# Altium footprint library ZabugorLib.PcbLib: 89 footprints (part 2 of 6)
Each footprint in its own frame and in the unit in brackets; x right, y up, seen from the top. Pads: shape width x height; smd on the part's side, far side on the other; paste and mask are expansions set on the pad; w line width, h text height; cw(c..) or ccw(c..) is an arc to the next point about the centre after c.
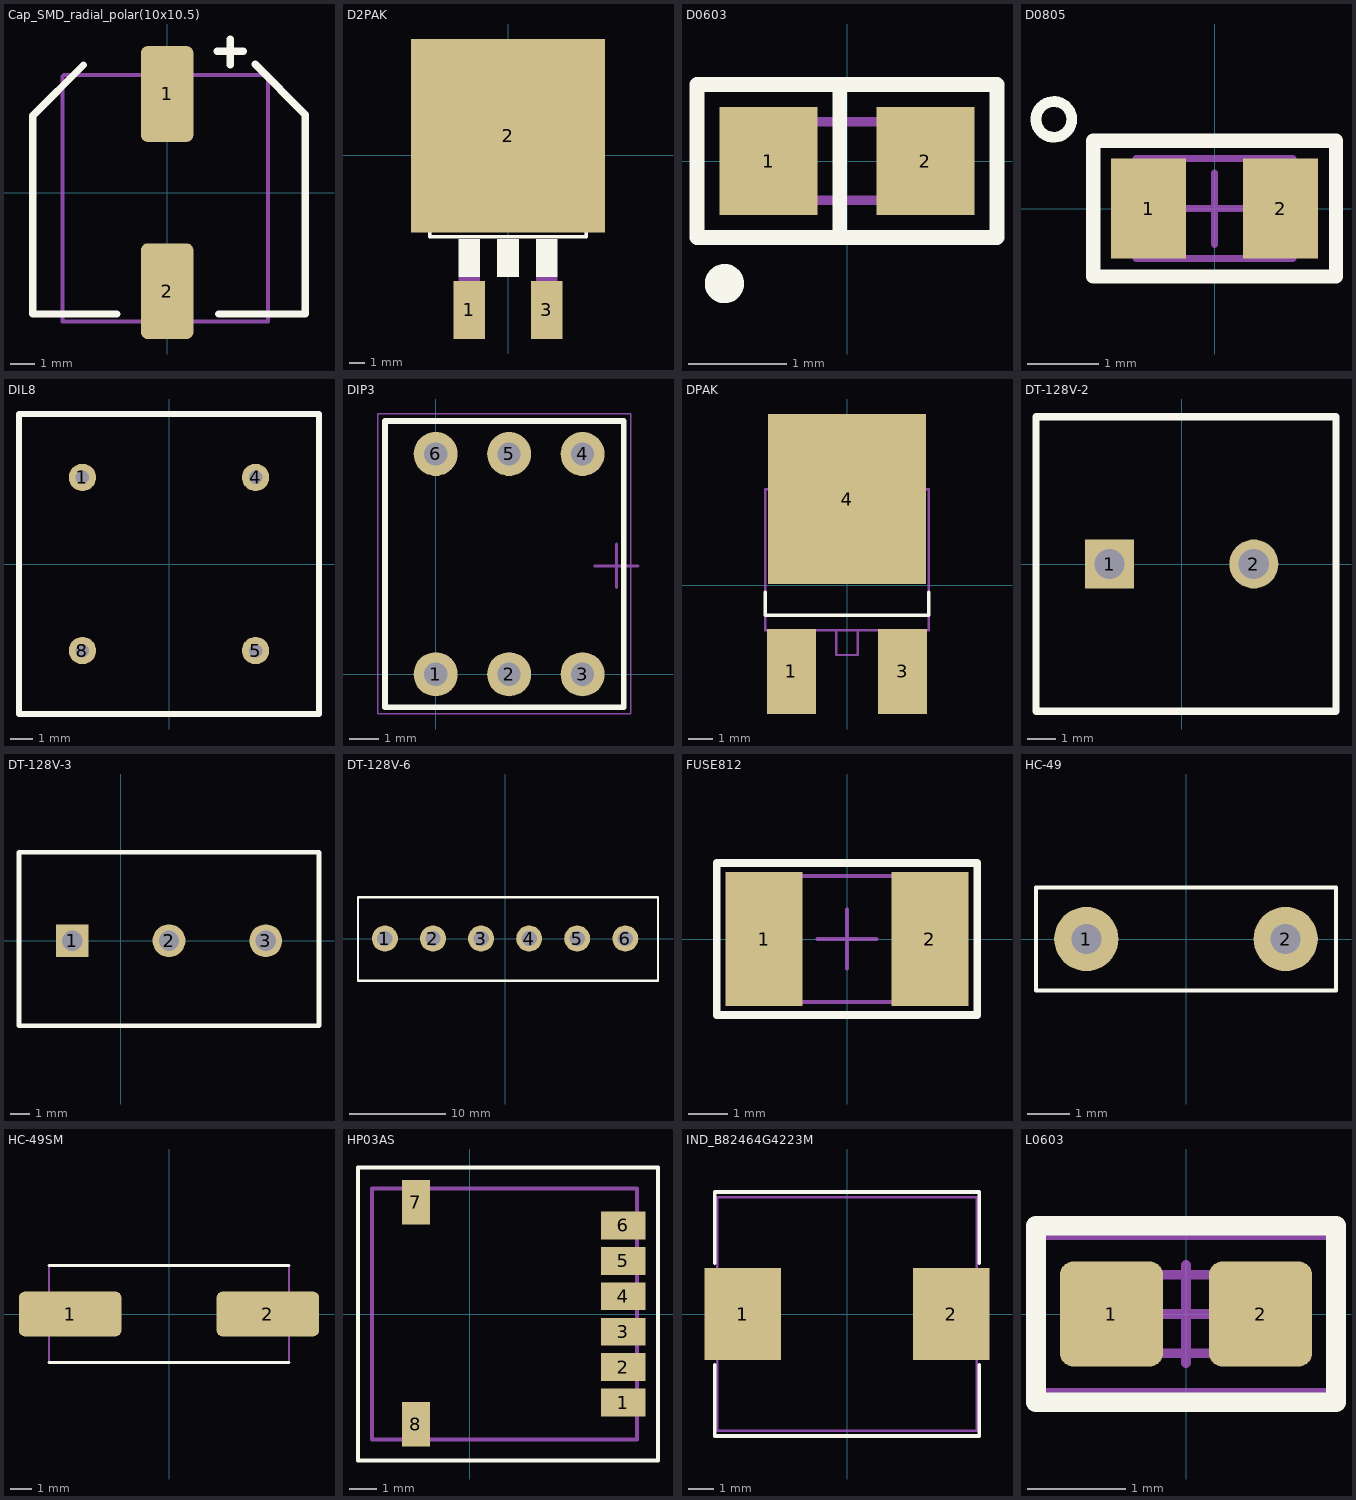
[diagram p1: the footprints below, top view; thin cyan lines are the x and y axes]

## Cap_SMD_radial_polar(10x10.5) [mm] "ECAP SMD, 220 мкФ, 35В"
height 10
pads (2):
  rrect25% 2.12x3.86 smd: 1(0,3.98) 2(0,-3.98)
Top Overlay:
  lines w0.3: -3.375,5.15 -5.425,3.1 -5.425,-4.9 -2.025,-4.9 ; 2.025,5.7 3.075,5.7 ; 2.075,-4.9 5.575,-4.9 5.575,3.1 ; 2.55,5.15 2.55,6.2 ; 3.55,5.175 5.575,3.15
Mechanical 7:
  lines w0.15: -4.225,-5.2 -4.225,4.7 -4.175,4.75 4.075,4.75 4.075,-5.2 -4.225,-5.2
3D body "User Library-ALU-F.STEP": height 10.2, standoff 0, extent -4.175,-5.15 4.125,4.75

## D2PAK [mil]
pads (3):
  rect 82x150 smd: 1(-100,-400) 3(100,-400)
  rect 500x500 smd: 2(0,50)
Top Overlay:
  rectangle: -128,-315 -72,-217
  rectangle: 72,-315 128,-217
  rectangle: -28,-315 28,-217
  lines w10: -202,-141 -202,-211 202,-211 202,-141
Mechanical 16:
  rectangle: -122,-425 -78,-369
  rectangle: -128,-371 -72,-315
  rectangle: 78,-425 122,-369
  rectangle: 72,-371 128,-315
  lines w10: -202,-211 -202,125 ; 202,-211 202,125 ; -202,125 -202,135 -133,179 123,179 202,125 ; -202,125 202,125
3D body "User Library-DPAK.step": height 198.23, standoff 0.67, extent -203.15,-442.91 196.85,158.02

## D0603 [mm]
height 1.1
pads (2):
  rect 1x1.1 smd: 1(-0.8,0) 2(0.8,0)
Top Overlay:
  circle w0.2: c-1.25,-1.25 r0.1
  lines w0.15: -0.075,-0.78 -0.075,0.78 ; -1.53,-0.78 1.53,-0.78 1.53,0.78 -1.53,0.78 -1.53,-0.78
Mechanical 9:
  text ".Comment" at -0.61,-1.33 h0.6
  text ".Designator" at -0.62,1 h0.8
Mechanical 11:
  lines w0.1: -0.7,-0.4 -0.7,0.4 ; -0.6,-0.4 -0.6,0.4 ; -0.5,-0.4 -0.5,0.4 ; -0.8,-0.4 -0.8,0.4 0.8,0.4 0.8,-0.4 -0.8,-0.4
3D body "User Library-LED_0603_R.STEP": height 0.6, standoff 0, extent -0.8,-0.4 0.8,0.4

## D0805 [mm] "Chip Resistor, 2-Leads, Body 2,10x1,30mm, IPC Medium Density"
height 0.55
pads (2):
  rect 1.05x1.4 smd: 1(-0.925,0) 2(0.925,0)
Top Overlay:
  circle w0.15: c-2.25,1.25 r0.25
  lines w0.2: -1.7,-0.95 -1.7,0.95 1.7,0.95 1.7,-0.95 -1.7,-0.95
Mechanical 9:
  text ".Comment" at -1,-0.5 h0.8
  text ".Designator" at -1,0.25 h1
Mechanical 11:
  lines w0.1: -1.1,-0.7 -1.1,0.7 1.1,0.7 1.1,-0.7 -1.1,-0.7
Mechanical 15:
  lines w0.05: -1.7,-0.95 1.7,-0.95 1.7,0.95 -1.7,0.95 -1.7,-0.95
  lines w0.1: -0.5,0 0.5,0 ; 0,-0.5 0,0.5
3D body "User Library-LED0805.step": height 0.8, standoff 0, extent -1.05,-0.675 1.05,0.675

## DIL8 [mm] "Кварцевый генератор 12.9х12.9"
pads (4):
  round 1.2 hole 0.6: 1(-3.81,3.81) 4(3.81,3.81) 5(3.81,-3.81) 8(-3.81,-3.81)
Top Overlay:
  lines w0.254: -6.6,-6.6 -6.6,6.6 6.6,6.6 6.6,-6.6 -6.6,-6.6
3D body "User Library-OSC_DIP-8.step": height 4.6, standoff -2, extent -6.35,-6.35 6.35,6.35

## DIP3 [mil]
pads (6):
  round 60 hole 31.5: 1(0,0) 2(100,0) 3(200,0) 4(200,300) 5(100,300) 6(0,300)
Top Overlay:
  lines w7.87: -68.9,-44.88 255.91,-44.88 255.91,344.88 -68.9,344.88 -68.9,-44.88
Mechanical 9:
  text ".Comment" at 49.21,118.11 h31.5
  text ".Designator" at 49.21,147.64 h39.37
Mechanical 11:
  lines w3.94: -68.9,-45.28 -68.9,344.49 255.91,344.49 255.91,-45.28 -68.9,-45.28
Mechanical 15:
  lines w1.97: -78.74,-54.13 265.75,-54.13 265.75,354.33 -78.74,354.33 -78.74,-54.13
  lines w3.94: 216.54,147.64 275.59,147.64 ; 246.06,118.11 246.06,177.17
3D body "User Library-switch 3.step": height 275.59, standoff -145.67, extent -68.9,-43.31 251.34,346.46

## DPAK [mm]
height 2.4
pads (3):
  rect 2x3.5 smd: 1(-2.285,-3.55) 3(2.285,-3.55)
  rect 6.5x7 smd: 4(0,3.55)
Top Overlay:
  lines w0.15: -3.36,-0.3 -3.36,-1.24 3.36,-1.24 3.36,-0.3
Mechanical 7:
  lines w0.1: -2.855,-1.85 -2.855,-4.44 -1.715,-4.44 -1.715,-1.85 ; -2.73,3.95 -2.73,5.98 2.73,5.98 2.73,3.95 ; -0.44,-1.85 -0.44,-2.87 0.44,-2.87 0.44,-1.85 ; 1.715,-1.85 1.715,-4.44 2.855,-4.44 2.855,-1.85 ; -3.36,-1.85 3.36,-1.85 3.36,3.95 -3.36,3.95 -3.36,-1.85
Mechanical 10:
  text ".Designator" at -0.85,8.28 h0.8
  text ".Comment" at -0.73,7.63 h0.6
3D body "User Library-D-PAK.step": height 2.3, standoff 0, extent -3.247,-3.625 3.247,5.875

## DT-128V-2 [mm]
pads (2):
  rect 1.7x1.7 hole 1.05: 1(-2.5,0)
  round 1.7 hole 1.05: 2(2.5,0)
Top Overlay:
  lines w0.254: -5.05,-5.1 -5.05,5.1 5.35,5.1 5.35,-5.1 -5.05,-5.1
3D body "User Library-DG128-5_0-02P-14.step": height 14.3, standoff -3.5, extent -5,-5.069 5.3,5.131

## DT-128V-3 [mm]
pads (3):
  rect 1.7x1.7 hole 1.05: 1(-2.5,0)
  round 1.7 hole 1.05: 2(2.5,0) 3(7.5,0)
Top Overlay:
  lines w0.254: -5.25,-4.394 10.25,-4.394 10.25,4.572 -5.25,4.572 -5.25,-4.394
3D body "DT128V_3.STEP": height 15.2, standoff -3.5, extent -5.25,-4.394 10.25,4.606

## DT-128V-6 [mm]
pads (6):
  round 2.7 hole 1.6: 1(-12.5,0) 2(-7.5,0) 3(-2.5,0) 4(2.5,0) 5(7.5,0) 6(12.5,0)
Top Overlay:
  lines w0.254: -15.3,-4.4 -4.35,-4.4 6.05,-4.4 15.9,-4.4 15.9,4.3 4.55,4.3 -5.85,4.3 -15.3,4.3 -15.3,-4.4
3D body "37822.stp": height 10, standoff -3.5, extent -14.985,-4.1 15.585,4.05

## FUSE812 [mm] "Самовосстанавливающийся предохранитель"
pads (2):
  rect 1.95x3.4 smd: 1(-2.1,0) 2(2.1,0)
Top Overlay:
  lines w0.2: -3.3,-1.925 -3.3,1.925 3.3,1.925 3.3,-1.925 -3.3,-1.925
Mechanical 9:
  text ".Designator" at -1.25,0.25 h1
  text ".Comment" at -1.25,-0.5 h0.8
Mechanical 11:
  lines w0.1: -2.325,-1.6 2.325,-1.6 2.325,1.6 -2.325,1.6 -2.325,-1.6
Mechanical 15:
  lines w0.05: -3.3,-1.925 3.3,-1.925 3.3,1.925 -3.3,1.925 -3.3,-1.925
  lines w0.1: -0.75,0 0.75,0 ; 0,-0.75 0,0.75
3D body "User Library-fuse1812.step": height 1.32, standoff 0, extent -2.41,-1.61 2.41,1.61

## HC-49 [mm] "Кварцевый резонатор"
pads (2):
  round 1.5 hole 0.7: 1(-2.325,0) 2(2.325,0)
Top Overlay:
  lines w0.1: -3.5,-1.2 -3.5,1.2 3.5,1.2 3.5,-1.2 -1.3,-1.2 -3.5,-1.2
3D body "User Library-HC49_Crystal.step": height 3.6, standoff -12.7, extent -5.675,-2.325 5.675,2.325

## HC-49SM [mm] "Кварцевый резонатор поверхностного монтажа"
pads (2):
  rrect25% 4.87x2.13 smd: 1(-4.7,0) 2(4.7,0)
Top Overlay:
  lines w0.15: -5.7,-2.3 5.7,-2.3 ; -5.7,2.3 5.7,2.3
Mechanical 7:
  lines w0.1: -5.7,-2.3 -5.7,2.3 5.7,2.3 5.7,-2.3 -5.7,-2.3
3D body "User Library-HC49_Crystal_SM.step": height 4.5, standoff -0.01, extent -6.95,-2.5 6.95,2.5

## HP03AS [mm] "Integrated pressure sensor"
pads (8):
  rect 1.6x1 smd: 1(5.5,-3.175) 2(5.5,-1.905) 3(5.5,-0.635) 4(5.5,0.635) 5(5.5,1.905) 6(5.5,3.175)
  rect 1x1.6 smd: 7(-1.925,4) 8(-1.925,-3.95)
Top Overlay:
  lines w0.15: -4,-5.25 -4,5.25 6.75,5.25 6.75,-5.25 -4,-5.25
Mechanical 7:
  lines w0.15: -3.5,-4.5 6,-4.5 6,4.5 -3.5,4.5 -3.5,-4.5
3D body "HP03SA.STEP": height 4.6, standoff -0.04, extent -3.525,-4.475 6.015,4.525

## IND_B82464G4223M [mm] "22 мкГн, 2.25 А, 10х10, Катушка индуктивности SMD"
pads (2):
  rect 3x3.6 smd: 1(-4.1,0) 2(4.1,0)
Top Overlay:
  lines w0.15: -5.2,-2 -5.2,-4.8 5.2,-4.8 5.2,-2 ; -5.2,2 -5.2,4.8 5.2,4.8 5.2,2
Mechanical 7:
  lines w0.1: -5.1,-4.6 -5.1,4.6 5.1,4.6 5.1,-4.6 -5.1,-4.6
Mechanical 10:
  text ".Comment" at -1.1,-6.1 h0.6
  text ".Designator" at -1.5,5.5 h0.8
3D body "User Library-10x10 SMT Power Inductor.step": height 4.8, standoff 0, extent -5.2,-5.2 5.2,5.2

## L0603 [mm]
height 0.8
pads (2):
  rrect25% 1.05x1.07 smd paste-5: 1(-0.76,0) 2(0.76,0)
Top Overlay:
  lines w0.2: -1.53,-0.9 1.53,-0.9 1.53,0.9 -1.53,0.9 -1.53,-0.9
Top Paste:
  region: -0.235,-0.405 -0.445,0 -0.235,0.405 -0.235,0.431 -0.255,0.479 -0.291,0.515 -0.339,0.535 -0.365,0.535 -1.155,0.535 -1.181,0.535 -1.229,0.515 -1.265,0.479 -1.285,0.431 -1.285,0.405 -1.285,-0.405 -1.285,-0.431 -1.265,-0.479 -1.229,-0.515 -1.181,-0.535 -1.155,-0.535 -0.365,-0.535 -0.339,-0.535 -0.291,-0.515 -0.255,-0.479 -0.235,-0.431
  region: 0.235,-0.405 0.445,0 0.235,0.405 0.235,0.431 0.255,0.479 0.291,0.515 0.339,0.535 0.365,0.535 1.155,0.535 1.181,0.535 1.229,0.515 1.265,0.479 1.285,0.431 1.285,0.405 1.285,-0.405 1.285,-0.431 1.265,-0.479 1.229,-0.515 1.181,-0.535 1.155,-0.535 0.365,-0.535 0.339,-0.535 0.291,-0.515 0.255,-0.479 0.235,-0.431
Mechanical 9:
  text ".Comment" at -1,-0.5 h0.8
  text ".Designator" at -1,0.25 h1
Mechanical 11:
  lines w0.1: -0.8,-0.4 0.8,-0.4 0.8,0.4 -0.8,0.4 -0.8,-0.4
Mechanical 15:
  lines w0.05: -1.53,-0.78 -1.53,0.78 1.53,0.78 1.53,-0.78 -1.53,-0.78
  lines w0.1: -0.5,0 0.5,0 ; 0,-0.5 0,0.5
3D body "User Library-FB_1608.STEP": height 0.8, standoff 0, extent -0.8,-0.4 0.8,0.4